# Altium footprint library 10-Diobe.PcbLib: 108 footprints (part 3 of 7) (continued)
## FUJI_M263_FLIP [mm] "IGBT Module, Body 94mm x 34mm, Screws on PCB Version" (continued)
  text "G1" at 48.121,12.004 h1.5
  text "E1" at 48.121,7.503 h1.5
  text "E2" at 48.121,-9.943 h1.5
  text "G2" at 48.121,-14.446 h1.5
  text "C2E1" at 20.689,7.805 h1.5
  text "E2" at -1.282,7.805 h1.5
  text "C2" at -24.396,7.827 h1.5
  text "C2E1" at -25.666,12.272 h1.5
  text "E2" at -1.142,12.272 h1.5
  text "C1" at 21.55,12.327 h1.5
Keep-Out Layer:
  board cut-out: 33.2,-16 33.2,-16.099 33.238,-16.292 33.314,-16.474 33.423,-16.637 33.563,-16.777 33.726,-16.886 33.908,-16.962 34.102,-17 34.2,-17 45.8,-17 45.899,-17 46.092,-16.962 46.274,-16.886 46.437,-16.777 46.577,-16.637 46.686,-16.474 46.762,-16.292 46.8,-16.099 46.8,-16 46.8,16 46.8,16.098 46.762,16.292 46.686,16.474 46.577,16.637 46.437,16.777 46.274,16.886 46.092,16.962 45.899,17 45.8,17 34.2,17 34.102,17 33.908,16.962 33.726,16.886 33.563,16.777 33.423,16.637 33.314,16.474 33.238,16.292 33.2,16.098 33.2,16
  board cut-out: -45.8,-6.8 -45.899,-6.8 -46.092,-6.762 -46.274,-6.686 -46.437,-6.577 -46.577,-6.437 -46.686,-6.274 -46.762,-6.092 -46.8,-5.898 -46.8,-5.8 -46.8,5.8 -46.8,5.898 -46.762,6.092 -46.686,6.274 -46.577,6.437 -46.437,6.577 -46.274,6.686 -46.092,6.762 -45.899,6.8 -45.8,6.8 -34.2,6.8 -34.102,6.8 -33.908,6.762 -33.726,6.686 -33.563,6.577 -33.423,6.437 -33.314,6.274 -33.238,6.092 -33.2,5.898 -33.2,5.8 -33.2,-5.8 -33.2,-5.898 -33.238,-6.092 -33.314,-6.274 -33.423,-6.437 -33.563,-6.577 -33.726,-6.686 -33.908,-6.762 -34.102,-6.8 -34.2,-6.8
Mechanical 1:
  lines w1.27: -46.8,-5.8 ccw(c-45.8,-5.8) -45.8,-6.8 -34.2,-6.8 ccw(c-34.2,-5.8) -33.2,-5.8 -33.2,5.8 ccw(c-34.2,5.8) -34.2,6.8 -45.8,6.8 ccw(c-45.8,5.8) -46.8,5.8 -46.8,-5.8 ; 33.2,-16 ccw(c34.2,-16) 34.2,-17 45.8,-17 ccw(c45.8,-16) 46.8,-16 46.8,16 ccw(c45.8,16) 45.8,17 34.2,17 ccw(c34.2,16) 33.2,16 33.2,-16
Mechanical 8:
  drawing of 155 lines, arcs and shapes, not listed
Mechanical 14:
  drawing of 257 lines, arcs and shapes, not listed
  text "G1" at 48.121,12.004 h1.5
  text "E1" at 48.121,7.503 h1.5
  text "E2" at 48.121,-9.943 h1.5
  text "G2" at 48.121,-14.446 h1.5
  text "C2E1" at 20.689,7.805 h1.5
  text "E2" at -1.282,7.805 h1.5
  text "C2" at -24.396,7.827 h1.5
  text "C2E1" at -25.666,12.272 h1.5
  text "E2" at -1.142,12.272 h1.5
  text "C1" at 21.55,12.327 h1.5
Drill Drawing:
  lines w0.1: -46.2,4.481 -46.8,4.699 ; -46.2,4.917 -46.8,4.699 ; -43.652,-6.2 -43.434,-6.8 ; -43.652,6.2 -43.434,6.8 ; -43.216,-6.2 -43.434,-6.8 ; -43.216,6.2 -43.434,6.8 ; -40.5,0 -40,0 ; -40,-0.5 -40,0 ; -40,0.5 -40,0 ; -39.5,0 -40,0 ; -39.497,-5.754 -34.279,-5.754 -33.528,-6.506 ; -34.434,-6.083 -33.528,-6.506 ; -33.951,-5.599 -33.528,-6.506 ; -33.8,4.481 -33.2,4.699 ; -33.8,4.917 -33.2,4.699 ; 33.8,5.878 33.2,6.096 ; 33.8,6.314 33.2,6.096 ; 36.348,-16.4 36.566,-17 ; 36.348,16.4 36.566,17 ; 36.784,-16.4 36.566,-17 ; 36.784,16.4 36.566,17 ; 39.5,0 40,0 ; 40,-0.5 40,0 ; 40,0.5 40,0 ; 40.5,0 40,0 ; 40.63,-15.886 45.848,-15.886 46.599,-16.637 ; 45.693,-16.214 46.599,-16.637 ; 46.176,-15.731 46.599,-16.637 ; 46.2,5.878 46.8,6.096 ; 46.2,6.314 46.8,6.096 ; -46.8,4.699 -33.2,4.699 ; -43.434,-6.8 -43.434,6.8 ; 33.2,-16 ccw(c34.2,-16) 34.2,-17 ; 33.2,-16 ccw(c34.2,-16) 34.2,-17 ; 33.2,-16 33.2,16 ; 33.2,-16 33.2,16 ; 33.2,6.096 46.8,6.096 ; 33.2,16 cw(c34.2,16) 34.2,17 ; 33.2,16 cw(c34.2,16) 34.2,17 ; 34.2,-17 45.8,-17 ; 34.2,-17 45.8,-17 ; 34.2,17 45.8,17 ; 34.2,17 45.8,17 ; 36.566,-17 36.566,17 ; 45.8,-17 ccw(c45.8,-16) 46.8,-16 ; 45.8,-17 ccw(c45.8,-16) 46.8,-16 ; 45.8,17 cw(c45.8,16) 46.8,16 ; 45.8,17 cw(c45.8,16) 46.8,16 ; 46.8,-16 46.8,16 ; 46.8,-16 46.8,16
  text "13.6mm" at -43.942,-0.635 h0.9
  text "13.6mm" at -39.243,5.207 h0.9
  text "r =1mm" at 40.757,-15.621 h0.9
  text "13.6mm" at 40.757,6.604 h0.9
  text "34mm" at 36.058,-0.635 h0.9
  text "r =1mm" at -39.37,-5.49 h0.9
3D body "FF150R12RT4_FLIP_Part2.stp": height 10.4, standoff -5.27, extent -27.75,-4.75 27.75,4.75
3D body "FUJI_M263.stp": height 30.51, standoff -0.05, extent -46.965,-16.992 47.035,17.003

## GBJ2510 [mm]
height 30.8
pads (4):
  oct 4x4 hole 2 mask+0.07: 1+(-12.2,-0.7)
  round 4 hole 2: 2~(-2.4,-0.7)
  round 4 hole 2 mask+0.07: 3~(4.9,-0.7) 4-(12.2,-0.7)
Top Overlay:
  lines w0.254: -7.754,-2.985 -7.754,2.641 ; -14.885,-2.985 14.85,-2.985 14.85,2.629 -14.885,2.629 -14.885,-2.985
3D body "4-4-1_8f.stp": height 0.1, standoff -1.7, extent -14.2,-2.7 -10.2,1.3
3D body "4-4-1_8.stp": height 0.1, standoff -1.7, extent -4.4,-2.7 -0.4,1.3
3D body "4-4-1_8.stp": height 0.1, standoff -1.7, extent 2.9,-2.7 6.9,1.3
3D body "4-4-1_8.stp": height 0.1, standoff -1.7, extent 10.2,-2.7 14.2,1.3
3D body "gbj2510.stp": height 23.5, standoff -3, extent -14.85,-2.2 14.85,2.2

## GMD2 [mm] "0.6X0.3"
height 30.8
pads (2):
  rect 0.19x0.31 smd mask+0.051: 1(-0.19,0) 2(0.19,0)
Top Overlay:
  lines w0.01: 0.178,-0.178 0.178,0.178
  lines w0.025: -0.305,-0.178 -0.305,0.178 0.279,0.178 0.279,-0.178 -0.305,-0.178
3D body "umd2.stp": height 0.29, standoff -0.02, extent -0.3,-0.152 0.3,0.148

## HMD8 [mm]
height 30.8
pads (8):
  rect 0.25x0.3 smd mask+0.051: 1(-0.6,-0.25) 2(-0.2,-0.25) 3(0.2,-0.25) 4(0.6,-0.254) 5(0.6,0.25) 6(0.2,0.25) 7(-0.2,0.25) 8(-0.6,0.25)
Top Overlay:
  lines w0.001: -0.254,0 0.244,0 ; 0,-0.259 0,0.239
  lines w0.051: -0.838,-0.483 -0.838,0.483 0.838,0.483 0.838,-0.483 -0.838,-0.483
3D body "hmd8.stp": height 0.3, standoff 0, extent -0.8,-0.406 0.8,0.394

## INFINEON_ECONODUAL2 [mm] "INFINEON EconoDUAL 2 Module"
height 17.5
pads (16):
  round 2.4 hole 1.7: 1(-13.33,20.95) 2(-9.52,20.95) 3(13.34,20.95) 4(17.15,20.95) 7(28.58,-20.95) 8(24.77,-20.95) 9(-5.71,-20.95) 10(-9.52,-20.95) 11(-24.76,-20.95) 12(-28.57,-20.95)
  rrect20% 12x13 hole 6.5: 5(53.8,14) 6(53.8,-14) 13(-53.8,-14) 14(-53.8,14)
  round 1 hole 12 unplated mask+5.5: MEC(-46.5,0) MEC(46.5,0)
Top Overlay:
  lines w0.2: -52.025,-7 -52.025,7 ; -47.3,-19.15 47.3,-19.15 ; -47.3,19.15 47.3,19.15 ; 52.025,-7 52.025,7 ; -61,-22.5 -61,-6.028 -53.6,-6.028 -53.6,6.028 -61,6.028 -61,22.5 61,22.5 61,6.028 53.6,6.028 53.6,-6.028 61,-6.028 61,-22.5 -61,-22.5
  text "6" at 50.434,-6.7 h1.2
  text "5" at 50.134,5.4 h1.2
  text "14" at -50.78,5.45 h1.2
  text "13" at -50.78,-6.45 h1.2
  text "12" at -29.25,-18.6 h1.2
  text "11" at -25.44,-18.6 h1.2
  text "10" at -10.2,-18.6 h1.2
  text "9" at -5.99,-18.7 h1.2
  text "8" at 24.49,-18.7 h1.2
  text "7" at 28.3,-18.7 h1.2
  text "4" at 16.8,17.6 h1.2
  text "3" at 13.034,17.6 h1.2
  text "2" at -9.8,17.6 h1.2
  text "1" at -13.6,17.6 h1.2
Mechanical 8:
  circle w0.1: c-13.33,20.95 r1.5
  lines w0.1: -54.3,-14 -53.8,-14 ; -54.3,14 -53.8,14 ; -53.8,-14.5 -53.8,-14 ; -53.8,-13.5 -53.8,-14 ; -53.8,13.5 -53.8,14 ; -53.8,14.5 -53.8,14 ; -53.3,-14 -53.8,-14 ; -53.3,14 -53.8,14 ; -47,0 -46.5,0 ; -46.5,-0.5 -46.5,0 ; -46.5,0.5 -46.5,0 ; -46,0 -46.5,0 ; -29.07,-20.95 -28.57,-20.95 ; -28.57,-21.45 -28.57,-20.95 ; -28.57,-20.45 -28.57,-20.95 ; -28.07,-20.95 -28.57,-20.95 ; -25.26,-20.95 -24.76,-20.95 ; -24.76,-21.45 -24.76,-20.95 ; -24.76,-20.45 -24.76,-20.95 ; -24.26,-20.95 -24.76,-20.95 ; -13.83,20.95 -13.33,20.95 ; -13.33,20.45 -13.33,20.95 ; -13.33,21.45 -13.33,20.95 ; -12.83,20.95 -13.33,20.95 ; -10.02,-20.95 -9.52,-20.95 ; -10.02,20.95 -9.52,20.95 ; -9.52,-21.45 -9.52,-20.95 ; -9.52,-20.45 -9.52,-20.95 ; -9.52,20.45 -9.52,20.95 ; -9.52,21.45 -9.52,20.95 ; -9.02,-20.95 -9.52,-20.95 ; -9.02,20.95 -9.52,20.95 ; -6.21,-20.95 -5.71,-20.95 ; -5.71,-21.45 -5.71,-20.95 ; -5.71,-20.45 -5.71,-20.95 ; -5.21,-20.95 -5.71,-20.95 ; -0.5,0 0,0 ; 0,-0.5 0,0 ; 0,0.5 0,0 ; 0.5,0 0,0 ; 12.84,20.95 13.34,20.95 ; 13.34,20.45 13.34,20.95 ; 13.34,21.45 13.34,20.95 ; 13.84,20.95 13.34,20.95 ; 16.65,20.95 17.15,20.95 ; 17.15,20.45 17.15,20.95 ; 17.15,21.45 17.15,20.95 ; 17.65,20.95 17.15,20.95 ; 24.27,-20.95 24.77,-20.95 ; 24.77,-21.45 24.77,-20.95 ; 24.77,-20.45 24.77,-20.95 ; 25.27,-20.95 24.77,-20.95 ; 28.08,-20.95 28.58,-20.95 ; 28.58,-21.45 28.58,-20.95 ; 28.58,-20.45 28.58,-20.95 ; 29.08,-20.95 28.58,-20.95 ; 46,0 46.5,0 ; 46.5,-0.5 46.5,0 ; 46.5,0.5 46.5,0 ; 47,0 46.5,0 ; 53.3,-14 53.8,-14 ; 53.3,14 53.8,14 ; 53.8,-14.5 53.8,-14 ; 53.8,-13.5 53.8,-14 ; 53.8,13.5 53.8,14 ; 53.8,14.5 53.8,14 ; 54.3,-14 53.8,-14 ; 54.3,14 53.8,14 ; -59.8,-19.3 -58.6,-20.5 -49,-20.5 -47.8,-19.3 -47.8,-8.7 -49,-7.5 -58.6,-7.5 -59.8,-8.7 -59.8,-19.3 ; -59.8,8.7 -59.8,19.3 -58.6,20.5 -49,20.5 -47.8,19.3 -47.8,8.7 -49,7.5 -58.6,7.5 -59.8,8.7 ; 47.8,-19.3 47.8,-8.7 49,-7.5 58.6,-7.5 59.8,-8.7 59.8,-19.3 58.6,-20.5 49,-20.5 47.8,-19.3 ; 47.8,8.7 47.8,19.3 49,20.5 58.6,20.5 59.8,19.3 59.8,8.7 58.6,7.5 49,7.5 47.8,8.7
Mechanical 14:
  lines w0.1: -55.1,-22.5 -55.1,-6.028 ; -55.1,6.028 -55.1,22.5 ; -53.6,-22.5 -53.6,22.5 ; -53.6,-6.028 -61,-6.028 -61,-22.5 61,-22.5 61,-6.028 53.6,-6.028 ; -53.6,6.028 -61,6.028 -61,22.5 61,22.5 61,6.028 53.6,6.028 ; 53.6,-22.5 53.6,22.5 ; 55.1,-22.5 55.1,-6.028 ; 55.1,6.028 55.1,22.5 ; -52.4,-19.15 52.4,-19.15 52.4,19.15 -52.4,19.15 -52.4,-19.15
  text "6" at 50.434,-6.7 h1.2
  text "5" at 50.134,5.4 h1.2
  text "14" at -50.78,5.45 h1.2
  text "13" at -50.78,-6.45 h1.2
  text "12" at -29.25,-18.6 h1.2
  text "11" at -25.44,-18.6 h1.2
  text "10" at -10.2,-18.6 h1.2
  text "9" at -5.99,-18.7 h1.2
  text "8" at 24.49,-18.7 h1.2
  text "7" at 28.3,-18.7 h1.2
  text "4" at 16.8,17.6 h1.2
  text "3" at 13.034,17.6 h1.2
  text "2" at -9.8,17.6 h1.2
  text "1" at -13.6,17.6 h1.2
3D body "INFINEON_ECONODUAL2.stp": height 17, standoff -3.5, extent -61,-22.5 61,22.5

## INFINEON_ECONODUAL2_a [mm] "INFINEON EconoDUAL 2 Module"
height 17.5
pads (10):
  round 2.4 hole 1.7: 1(-13.33,20.95) 2(-9.52,20.95) 3(13.34,20.95) 4(17.15,20.95) 7(28.58,-20.95) 8(24.77,-20.95) 9(-5.71,-20.95) 10(-9.52,-20.95) 11(-24.76,-20.95) 12(-28.57,-20.95)
Top Overlay:
  lines w0.2: -52.025,-7 -52.025,7 ; -47.3,-19.15 47.3,-19.15 ; -47.3,19.15 47.3,19.15 ; 52.025,-7 52.025,7 ; -61,-22.5 -61,-6.028 -53.6,-6.028 -53.6,6.028 -61,6.028 -61,22.5 61,22.5 61,6.028 53.6,6.028 53.6,-6.028 61,-6.028 61,-22.5 -61,-22.5
  text "6" at 50.434,-6.7 h1.2
  text "5" at 50.134,5.4 h1.2
  text "14" at -50.78,5.45 h1.2
  text "13" at -50.78,-6.45 h1.2
  text "12" at -29.25,-18.6 h1.2
  text "11" at -25.44,-18.6 h1.2
  text "10" at -10.2,-18.6 h1.2
  text "9" at -5.99,-18.7 h1.2
  text "8" at 24.49,-18.7 h1.2
  text "7" at 28.3,-18.7 h1.2
  text "4" at 16.8,17.6 h1.2
  text "3" at 13.034,17.6 h1.2
  text "2" at -9.8,17.6 h1.2
  text "1" at -13.6,17.6 h1.2
Mechanical 8:
  circle w0.1: c-13.33,20.95 r1.5
  lines w0.1: -54.3,-14 -53.8,-14 ; -54.3,14 -53.8,14 ; -53.8,-14.5 -53.8,-14 ; -53.8,-13.5 -53.8,-14 ; -53.8,13.5 -53.8,14 ; -53.8,14.5 -53.8,14 ; -53.3,-14 -53.8,-14 ; -53.3,14 -53.8,14 ; -47,0 -46.5,0 ; -46.5,-0.5 -46.5,0 ; -46.5,0.5 -46.5,0 ; -46,0 -46.5,0 ; -29.07,-20.95 -28.57,-20.95 ; -28.57,-21.45 -28.57,-20.95 ; -28.57,-20.45 -28.57,-20.95 ; -28.07,-20.95 -28.57,-20.95 ; -25.26,-20.95 -24.76,-20.95 ; -24.76,-21.45 -24.76,-20.95 ; -24.76,-20.45 -24.76,-20.95 ; -24.26,-20.95 -24.76,-20.95 ; -13.83,20.95 -13.33,20.95 ; -13.33,20.45 -13.33,20.95 ; -13.33,21.45 -13.33,20.95 ; -12.83,20.95 -13.33,20.95 ; -10.02,-20.95 -9.52,-20.95 ; -10.02,20.95 -9.52,20.95 ; -9.52,-21.45 -9.52,-20.95 ; -9.52,-20.45 -9.52,-20.95 ; -9.52,20.45 -9.52,20.95 ; -9.52,21.45 -9.52,20.95 ; -9.02,-20.95 -9.52,-20.95 ; -9.02,20.95 -9.52,20.95 ; -6.21,-20.95 -5.71,-20.95 ; -5.71,-21.45 -5.71,-20.95 ; -5.71,-20.45 -5.71,-20.95 ; -5.21,-20.95 -5.71,-20.95 ; -0.5,0 0,0 ; 0,-0.5 0,0 ; 0,0.5 0,0 ; 0.5,0 0,0 ; 12.84,20.95 13.34,20.95 ; 13.34,20.45 13.34,20.95 ; 13.34,21.45 13.34,20.95 ; 13.84,20.95 13.34,20.95 ; 16.65,20.95 17.15,20.95 ; 17.15,20.45 17.15,20.95 ; 17.15,21.45 17.15,20.95 ; 17.65,20.95 17.15,20.95 ; 24.27,-20.95 24.77,-20.95 ; 24.77,-21.45 24.77,-20.95 ; 24.77,-20.45 24.77,-20.95 ; 25.27,-20.95 24.77,-20.95 ; 28.08,-20.95 28.58,-20.95 ; 28.58,-21.45 28.58,-20.95 ; 28.58,-20.45 28.58,-20.95 ; 29.08,-20.95 28.58,-20.95 ; 46,0 46.5,0 ; 46.5,-0.5 46.5,0 ; 46.5,0.5 46.5,0 ; 47,0 46.5,0 ; 53.3,-14 53.8,-14 ; 53.3,14 53.8,14 ; 53.8,-14.5 53.8,-14 ; 53.8,-13.5 53.8,-14 ; 53.8,13.5 53.8,14 ; 53.8,14.5 53.8,14 ; 54.3,-14 53.8,-14 ; 54.3,14 53.8,14 ; -59.8,-19.3 -58.6,-20.5 -49,-20.5 -47.8,-19.3 -47.8,-8.7 -49,-7.5 -58.6,-7.5 -59.8,-8.7 -59.8,-19.3 ; -59.8,8.7 -59.8,19.3 -58.6,20.5 -49,20.5 -47.8,19.3 -47.8,8.7 -49,7.5 -58.6,7.5 -59.8,8.7 ; 47.8,-19.3 47.8,-8.7 49,-7.5 58.6,-7.5 59.8,-8.7 59.8,-19.3 58.6,-20.5 49,-20.5 47.8,-19.3 ; 47.8,8.7 47.8,19.3 49,20.5 58.6,20.5 59.8,19.3 59.8,8.7 58.6,7.5 49,7.5 47.8,8.7
Mechanical 14:
  lines w0.1: -55.1,-22.5 -55.1,-6.028 ; -55.1,6.028 -55.1,22.5 ; -53.6,-22.5 -53.6,22.5 ; -53.6,-6.028 -61,-6.028 -61,-22.5 61,-22.5 61,-6.028 53.6,-6.028 ; -53.6,6.028 -61,6.028 -61,22.5 61,22.5 61,6.028 53.6,6.028 ; 53.6,-22.5 53.6,22.5 ; 55.1,-22.5 55.1,-6.028 ; 55.1,6.028 55.1,22.5 ; -52.4,-19.15 52.4,-19.15 52.4,19.15 -52.4,19.15 -52.4,-19.15
  text "6" at 50.434,-6.7 h1.2
  text "5" at 50.134,5.4 h1.2
  text "14" at -50.78,5.45 h1.2
  text "13" at -50.78,-6.45 h1.2
  text "12" at -29.25,-18.6 h1.2
  text "11" at -25.44,-18.6 h1.2
  text "10" at -10.2,-18.6 h1.2
  text "9" at -5.99,-18.7 h1.2
  text "8" at 24.49,-18.7 h1.2
  text "7" at 28.3,-18.7 h1.2
  text "4" at 16.8,17.6 h1.2
  text "3" at 13.034,17.6 h1.2
  text "2" at -9.8,17.6 h1.2
  text "1" at -13.6,17.6 h1.2
3D body "INFINEON_ECONODUAL2.stp": height 17, standoff -3.5, extent -61,-22.5 61,22.5

## IXYS_IXBOD 1-06..10 [mm] "Lead spacing 7.5mm Body 10mm X 4mm"
height 9
pads (2):
  round 1.9 hole 1.2: 1(-3.75,0) 2(3.75,0)
Top Overlay:
  lines w0.2: -4.816,1.5 4.816,1.5 ; -5,0 -4.693,2.5 4.693,2.5 5,0 4.816,-1.5 -4.816,-1.5 -5,0
Mechanical 8:
  lines w0.1: -4.25,0 -3.75,0 ; -3.75,-0.5 -3.75,0 ; -3.75,0.5 -3.75,0 ; -3.25,0 -3.75,0 ; -0.5,0 0,0 ; 0,-0.5 0,0 ; 0,0.5 0,0 ; 0.5,0 0,0 ; 3.25,0 3.75,0 ; 3.75,-0.5 3.75,0 ; 3.75,0.5 3.75,0 ; 4.25,0 3.75,0
Mechanical 14:
  lines w0.1: -4.816,1.5 4.816,1.5 ; -5,0 -4.693,2.5 4.693,2.5 5,0 4.816,-1.5 -4.816,-1.5 -5,0
3D body "IXYS_IXBOD 1-06..10.stp": height 9, standoff -4, extent -5,-1.5 5,2.5
3D body "v280-170.stp": height 0.02, standoff -1.65, extent -5.15,-1.4 -2.35,1.4
3D body "v280-170.stp": height 0.02, standoff -1.65, extent 2.35,-1.4 5.15,1.4

## IXYS_IXBOD 1-12R..42 [mm] "Lead spacing 45.7mm Body 54.5mm X 7.5mm"
height 19
pads (2):
  round 1.9 hole 1.2: 1(-22.86,0) 2(22.86,0)
Top Overlay:
  lines w0.2: -24.75,-3.75 -24.75,3.75 ; -3.75,0 3.75,0 ; -0.866,0 0.866,-1 0.866,1 ; -27.25,-3.75 -27.25,3.75 27.25,3.75 27.25,-3.75 -27.25,-3.75
  text "A" at 17.175,-0.75 h1.5
  text "K" at -18.454,-0.75 h1.5
Mechanical 8:
  lines w0.1: -23.35,0 -22.85,0 ; -22.85,-0.5 -22.85,0 ; -22.85,0.5 -22.85,0 ; -22.35,0 -22.85,0 ; -0.5,0 0,0 ; 0,-0.5 0,0 ; 0,0.5 0,0 ; 0.5,0 0,0 ; 22.35,0 22.85,0 ; 22.85,-0.5 22.85,0 ; 22.85,0.5 22.85,0 ; 23.35,0 22.85,0
Mechanical 14:
  lines w0.1: -24.75,-3.75 -24.75,3.75 ; -3.75,0 3.75,0 ; -0.866,0 0.866,-1 0.866,1 ; -27.25,-3.75 -27.25,3.75 27.25,3.75 27.25,-3.75 -27.25,-3.75
  text "A" at 17.175,-0.75 h1.5
  text "K" at -18.454,-0.75 h1.5
3D body "IXYS_IXBOD 1-12..42.stp": height 19, standoff -3.1, extent -27.25,-3.75 27.25,3.75

## IXYS_SOT-227B_FLIP [mm] "IXYS SOT-227B (Minibloc) Case, Body 38.01mm x 25.42mm, Screws on PCB Version"
height 12.22
pads (4):
  rrect50% 9.5x9.5 hole 4.4: 1(-7.5,6.35) 2(7.5,6.35) 3(7.5,-6.35) 4(-7.5,-6.35)
via 10.25,4.763 diameter 1 hole 0.5
via 7.5,3.175 diameter 1 hole 0.5
via 4.75,4.763 diameter 1 hole 0.5
via 4.75,7.938 diameter 1 hole 0.5
via 7.5,9.525 diameter 1 hole 0.5
via 10.25,7.938 diameter 1 hole 0.5
via -4.75,4.763 diameter 1 hole 0.5
via -7.5,3.175 diameter 1 hole 0.5
via -10.25,4.763 diameter 1 hole 0.5
via -10.25,7.938 diameter 1 hole 0.5
via -7.5,9.525 diameter 1 hole 0.5
via -4.75,7.938 diameter 1 hole 0.5
via 10.25,-7.938 diameter 1 hole 0.5
via 7.5,-9.525 diameter 1 hole 0.5
via 4.75,-7.938 diameter 1 hole 0.5
via 4.75,-4.763 diameter 1 hole 0.5
via 7.5,-3.175 diameter 1 hole 0.5
via 10.25,-4.763 diameter 1 hole 0.5
via -4.75,-7.938 diameter 1 hole 0.5
via -7.5,-9.525 diameter 1 hole 0.5
via -10.25,-7.938 diameter 1 hole 0.5
via -10.25,-4.763 diameter 1 hole 0.5
via -7.5,-3.175 diameter 1 hole 0.5
via -4.75,-4.763 diameter 1 hole 0.5
Top Overlay:
  circle w0.2: c-15.1,0 r2.15
  lines w0.2: -15.85,-11.521 -15.85,-12.479 ; -15.85,-10.521 -15.85,-9.521 ; -15.85,9.479 -15.85,10.479 ; -15.85,11.479 -15.85,12.479 ; -15.628,-8.521 -15.043,-7.521 ; -15.603,8.479 -15.018,7.479 ; -14.457,-6.521 -13.871,-5.521 ; -14.432,6.479 -13.847,5.479 ; -13.286,-4.521 -12.7,-3.521 ; -13.261,4.479 -12.676,3.479 ; -12.115,-2.521 -11.778,-1.945 ccw(c-15.1,0) -11.563,-1.521 ; -12.09,2.479 -11.778,1.945 cw(c-15.1,0) -11.545,1.479 ; -11.285,-0.521 ccw(c-15.1,0) -11.28,0.479 ; 11.28,0.479 ccw(c15.1,0) 11.285,-0.521 ; 11.545,1.479 cw(c15.1,0) 11.778,1.945 12.09,2.479 ; 11.563,-1.521 ccw(c15.1,0) 11.778,-1.945 12.115,-2.521 ; 12.676,3.479 13.261,4.479 ; 12.7,-3.521 13.286,-4.521 ; 13.847,5.479 14.432,6.479 ; 13.871,-5.521 14.457,-6.521 ; 15.018,7.479 15.603,8.479 ; 15.043,-7.521 15.628,-8.521 ; 15.85,-11.521 15.85,-12.479 ; 15.85,-10.521 15.85,-9.521 ; 15.85,9.479 15.85,10.479 ; 15.85,11.479 15.85,12.479 ; -15.85,-12.479 15.85,-12.479 ; -15.85,-12.479 -17.5,-12.479 -19.1,-10.879 -19.1,10.879 -17.5,12.479 -15.85,12.479 ; -15.85,12.479 15.85,12.479 ; 15.1,-2.15 cw(c15.1,0) 15.1,2.15 ; 15.1,-2.15 19.1,-2.15 ; 15.1,-2.15 19.1,-2.15 ; 15.1,2.15 19.1,2.15 ; 15.1,2.15 19.1,2.15 ; 15.85,-12.479 17.5,-12.479 19.1,-10.879 19.1,-2.15 ; 15.85,12.479 17.5,12.479 19.1,10.879 19.1,2.15
Mechanical 8:
  lines w0.1: -15.1,0 -16.1,0 -15.1,0 ; -15.1,0 -14.1,0 -15.1,0 ; -15.1,0 -15.1,1 -15.1,0 ; -15.1,0 -15.1,-1 -15.1,0 ; -7.5,-6.35 -8.5,-6.35 -7.5,-6.35 ; -7.5,-6.35 -6.5,-6.35 -7.5,-6.35 ; -7.5,-6.35 -7.5,-5.35 -7.5,-6.35 ; -7.5,-6.35 -7.5,-7.35 -7.5,-6.35 ; -7.5,6.35 -8.5,6.35 -7.5,6.35 ; -7.5,6.35 -6.5,6.35 -7.5,6.35 ; -7.5,6.35 -7.5,7.35 -7.5,6.35 ; -7.5,6.35 -7.5,5.35 -7.5,6.35 ; 0,0 -1,0 0,0 ; 0,0 1,0 0,0 ; 0,0 0,1 0,0 ; 0,0 0,-1 0,0 ; 7.5,-6.35 6.5,-6.35 7.5,-6.35 ; 7.5,-6.35 8.5,-6.35 7.5,-6.35 ; 7.5,-6.35 7.5,-5.35 7.5,-6.35 ; 7.5,-6.35 7.5,-7.35 7.5,-6.35 ; 7.5,6.35 6.5,6.35 7.5,6.35 ; 7.5,6.35 8.5,6.35 7.5,6.35 ; 7.5,6.35 7.5,7.35 7.5,6.35 ; 7.5,6.35 7.5,5.35 7.5,6.35 ; 15.1,0 14.1,0 15.1,0 ; 15.1,0 16.1,0 15.1,0 ; 15.1,0 15.1,1 15.1,0 ; 15.1,0 15.1,-1 15.1,0
Mechanical 14:
  circle w0.1: c-7.5,6.35 r2.2
  circle w0.1: c7.5,6.35 r2.2
  circle w0.1: c7.5,-6.35 r2.2
  circle w0.1: c-7.5,-6.35 r2.2
  circle w0.1: c-15.1,0 r2.15
  lines w0.1: -15.85,-11.521 -15.85,-12.479 ; -15.85,-10.521 -15.85,-9.521 ; -15.85,9.479 -15.85,10.479 ; -15.85,11.479 -15.85,12.479 ; -15.628,-8.521 -15.043,-7.521 ; -15.603,8.479 -15.018,7.479 ; -14.457,-6.521 -13.871,-5.521 ; -14.432,6.479 -13.847,5.479 ; -13.286,-4.521 -12.7,-3.521 ; -13.261,4.479 -12.676,3.479 ; -12.115,-2.521 -11.778,-1.945 ccw(c-15.1,0) -11.563,-1.521 ; -12.09,2.479 -11.778,1.945 cw(c-15.1,0) -11.545,1.479 ; -11.5,-10.521 -11.5,-11.314 -11.1,-11.314 ; -11.5,-9.521 -11.5,-8.521 ; -11.5,-7.521 -11.5,-6.521 ; -11.5,-5.521 -11.5,-4.521 ; -11.5,-3.521 -11.5,-3.342 ; -11.5,3.479 -11.5,3.342 -10.637,2.479 ; -11.5,4.479 -11.5,5.479 ; -11.5,6.479 -11.5,7.479 ; -11.5,8.479 -11.5,9.479 ; -11.5,10.479 -11.5,11.314 -11.1,11.314 ; -11.285,-0.521 ccw(c-15.1,0) -11.28,0.479 ; -10.1,-11.314 -9.1,-11.314 ; -10.1,11.314 -9.1,11.314 ; -10,1.842 -9.1,1.842 ; -8.1,-11.314 -7.1,-11.314 ; -8.1,1.842 -7.1,1.842 ; -8.1,11.314 -7.1,11.314 ; -6.1,-11.314 -5.1,-11.314 ; -6.1,1.842 -5.1,1.842 ; -6.1,11.314 -5.1,11.314 ; -5.1,-1.842 -6.1,-1.842 -5,-1.842 ; -4.363,2.479 -3.5,3.342 -3.5,3.479 ; -4.1,-11.314 -3.5,-11.314 -3.5,-10.521 ; -4.1,11.314 -3.5,11.314 -3.5,10.479 ; -3.5,-9.521 -3.5,-8.521 ; -3.5,-7.521 -3.5,-6.521 ; -3.5,-5.521 -3.5,-4.521 ; -3.5,-3.521 -3.5,-3.342 ; -3.5,4.479 -3.5,5.479 ; -3.5,6.479 -3.5,7.479 ; -3.5,8.479 -3.5,9.479 ; 3.5,-10.521 3.5,-11.314 3.9,-11.314 ; 3.5,-9.521 3.5,-8.521 ; 3.5,-7.521 3.5,-6.521 ; 3.5,-5.521 3.5,-4.521 ; 3.5,-3.521 3.5,-3.342 4.321,-2.521 ; 3.5,3.479 3.5,3.342 4.363,2.479 ; 3.5,4.479 3.5,5.479 ; 3.5,6.479 3.5,7.479 ; 3.5,8.479 3.5,9.479 ; 3.5,10.479 3.5,11.314 3.9,11.314 ; 4.9,-11.314 5.9,-11.314 ; 4.9,11.314 5.9,11.314 ; 5,-1.842 5.9,-1.842 ; 5,1.842 5.9,1.842 ; 6.9,-11.314 7.9,-11.314 ; 6.9,-1.842 7.9,-1.842 ; 6.9,1.842 7.9,1.842 ; 6.9,11.314 7.9,11.314 ; 8.9,-11.314 9.9,-11.314 ; 8.9,-1.842 9.9,-1.842 ; 8.9,1.842 9.9,1.842 ; 8.9,11.314 9.9,11.314 ; 10.637,2.479 11.5,3.342 11.5,3.479 ; 10.679,-2.521 11.5,-3.342 11.5,-3.521 ; 10.9,-11.314 11.5,-11.314 11.5,-10.521 ; 10.9,11.314 11.5,11.314 11.5,10.479 ; 11.28,0.479 ccw(c15.1,0) 11.285,-0.521 ; 11.5,-9.521 11.5,-8.521 ; 11.5,-7.521 11.5,-6.521 ; 11.5,-5.521 11.5,-4.521 ; 11.5,4.479 11.5,5.479 ; 11.5,6.479 11.5,7.479 ; 11.5,8.479 11.5,9.479 ; 11.545,1.479 cw(c15.1,0) 11.778,1.945 12.09,2.479 ; 11.563,-1.521 ccw(c15.1,0) 11.778,-1.945 12.115,-2.521 ; 12.676,3.479 13.261,4.479 ; 12.7,-3.521 13.286,-4.521 ; 13.847,5.479 14.432,6.479 ; 13.871,-5.521 14.457,-6.521 ; 15.018,7.479 15.603,8.479 ; 15.043,-7.521 15.628,-8.521 ; 15.85,-11.521 15.85,-12.479 ; 15.85,-10.521 15.85,-9.521 ; 15.85,9.479 15.85,10.479 ; 15.85,11.479 15.85,12.479 ; -15.85,-12.479 -17.5,-12.479 -19.1,-10.879 -19.1,10.879 -17.5,12.479 -15.85,12.479 ; -15.85,-12.479 15.85,-12.479 ; -15.85,12.479 15.85,12.479 ; -11.5,-3.342 -10.679,-2.521 -11.5,-3.342 ; -3.5,-3.342 -4.321,-2.521 -3.5,-3.342 ; 15.1,-2.15 cw(c15.1,0) 15.1,2.15 ; 15.1,-2.15 19.1,-2.15 ; 15.1,-2.15 19.1,-2.15 ; 15.1,2.15 19.1,2.15 ; 15.1,2.15 19.1,2.15 ; 15.85,-12.479 17.5,-12.479 19.1,-10.879 19.1,-2.15 ; 15.85,12.479 17.5,12.479 19.1,10.879 19.1,2.15 ; -10,-1.842 -9.1,-1.842 -10,-1.842 ; -8.1,-1.842 -7.1,-1.842 -8.1,-1.842
3D body "IXYS_SOT-227B_FLIP_Part2.stp": height 10.24, standoff -4.69, extent -11.5,-10.365 11.5,10.365
3D body "IXYS_SOT-227B_FLIP.stp": height 12.02, standoff -4.69, extent -19.05,-12.625 19.05,12.625